# Altium footprint library Mine.PcbLib: 306 footprints (part 4 of 20)
Each footprint in its own frame and in the unit in brackets; x right, y up, seen from the top. Pads: shape width x height; smd on the part's side, far side on the other; paste and mask are expansions set on the pad; w line width, h text height; cw(c..) or ccw(c..) is an arc to the next point about the centre after c.
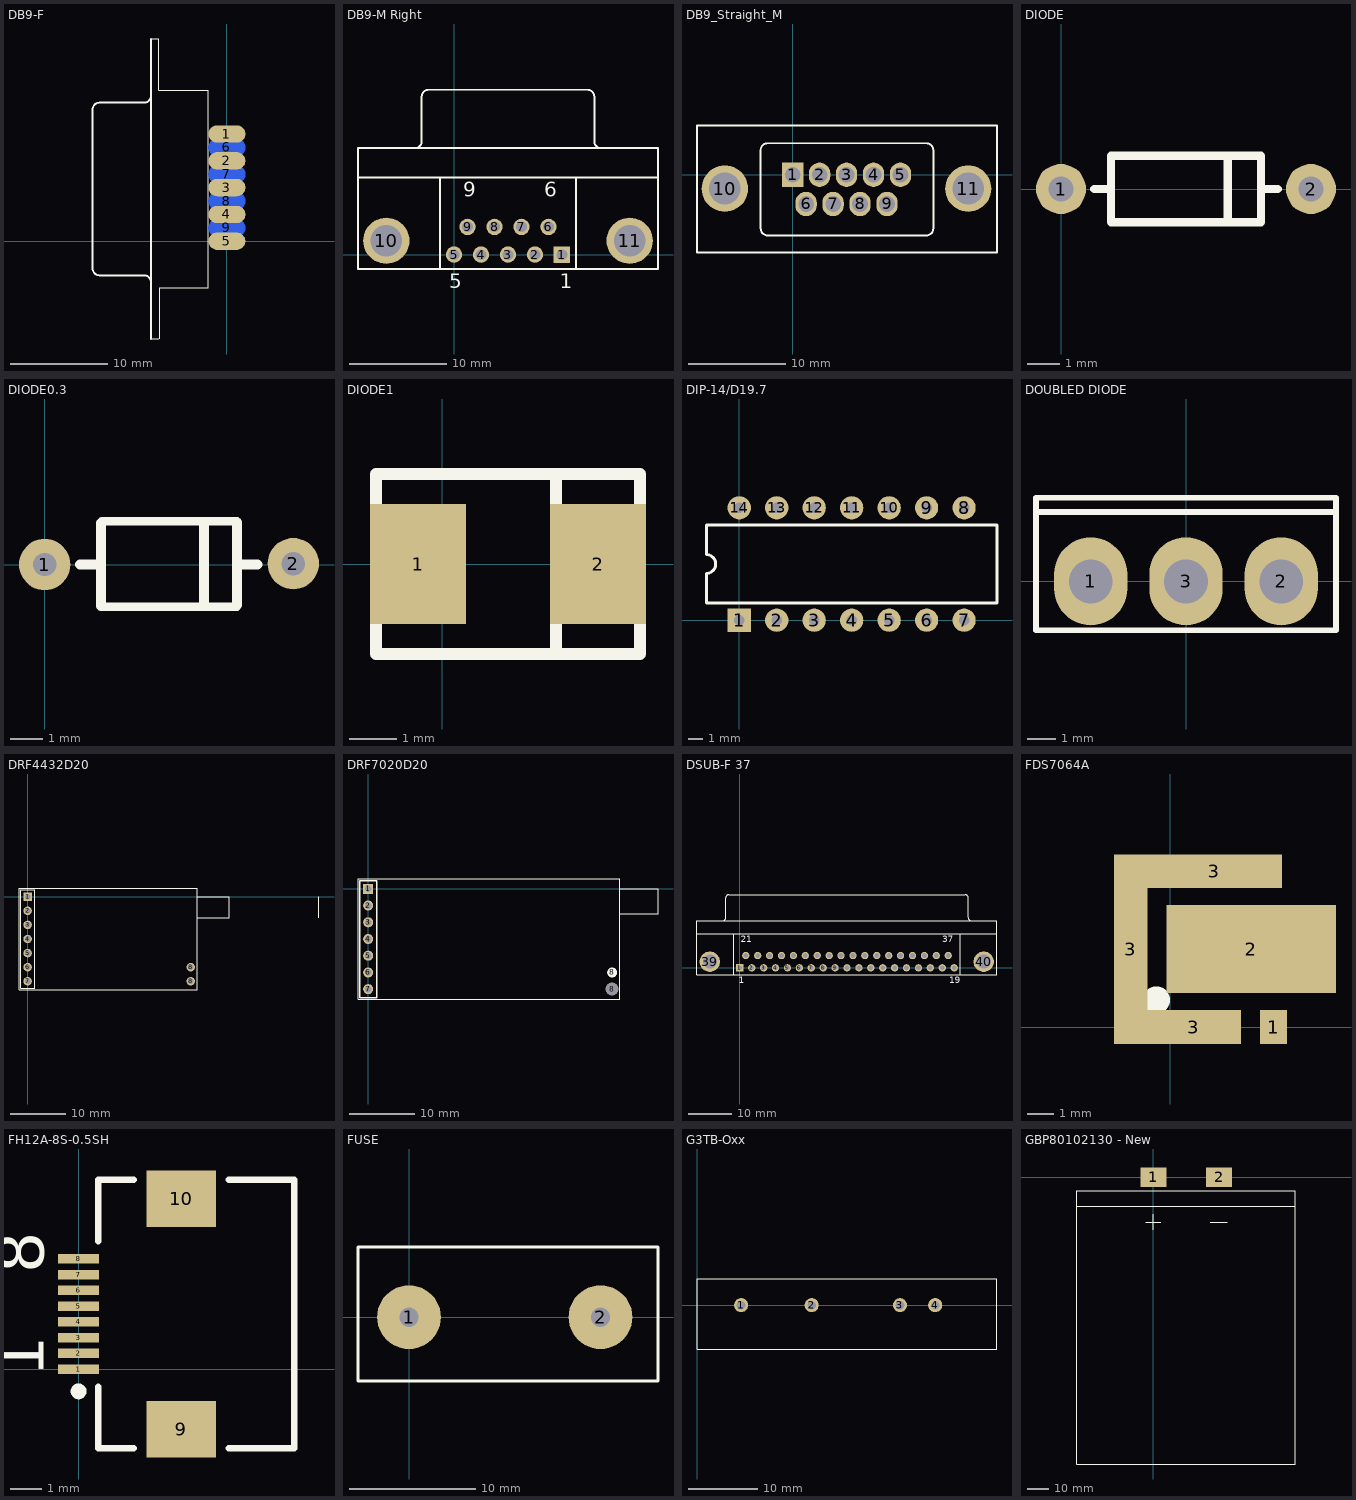
[diagram p3: the footprints below, top view; thin cyan lines are the x and y axes]

## DB9-F [mil]
pads (9):
  oval 150x70 smd: 1(0,433.33) 2(0,325) 3(0,216.67) 4(0,108.33) 5(0,0)
  oval 150x70 smd far side: 6(0,379) 7(0,270.67) 8(0,162.33) 9(0,54)
Top Overlay:
  lines w5: -307.09,-395.26 -275.59,-395.26 ; -307.09,817.34 -275.59,817.34 -275.59,610.24 -74.8,610.24 -74.8,-188.98 -271.65,-188.98 -271.65,-395.26
  lines w7.87: -515.94,-137.78 cw(c-515.94,-110.42) -543.31,-110.42 -543.31,532.5 cw(c-515.94,532.5) -515.94,559.86 ; -515.75,-137.98 -334.65,-137.98 cw(c-334.65,-165.34) -307.28,-165.34 ; -515.75,560.05 -334.65,560.05 ccw(c-334.65,587.42) -307.28,587.42 ; -307.09,-395.26 -307.09,817.34

## DB9-M Right [mm]
height 13
pads (11):
  rect 1.69x1.69 hole 1.09: 1(11.08,0)
  round 1.69 hole 1.09: 2(8.31,0) 3(5.54,0) 4(2.77,0) 5(0,0) 6(9.695,2.84) 7(6.925,2.84) 8(4.155,2.84) 9(1.385,2.84)
  round 4.76 hole 3.26: 10(-6.955,1.42) 11(18.035,1.42)
Top Overlay:
  lines w0.2: -9.86,7.92 20.94,7.92 ; -4.02,10.925 ccw(c-4.02,11.62) -3.325,11.62 -3.325,16.22 ; -3.32,16.225 cw(c-2.625,16.225) -2.625,16.92 13.705,16.92 cw(c13.705,16.225) 14.4,16.225 ; -1.46,-1.48 -1.46,7.92 ; 12.54,-1.48 12.54,7.92 ; 14.405,16.22 14.405,11.62 ccw(c15.1,11.62) 15.1,10.925 ; -9.86,-1.48 20.94,-1.48 20.94,10.92 -9.86,10.92 -9.86,-1.48
  text "1" at 10.861,-3.455 h1.5
  text "6" at 9.25,5.945 h1.5
  text "9" at 0.94,5.945 h1.5
  text "5" at -0.469,-3.455 h1.5

## DB9_Straight_M [mm]
height 12
pads (11):
  rect 2.2x2.5 hole 1.6: 1(0,0)
  oval 2.2x2.5 hole 1.6: 2(2.77,0) 3(5.54,0) 4(8.31,0) 5(11.08,0) 6(1.385,-3) 7(4.155,-3) 8(6.925,-3) 9(9.695,-3)
  round 4.76 hole 3.26: 10(-6.955,-1.42) 11(18.035,-1.42)
Top Overlay:
  lines w0.2: -3.277,-5.523 -3.277,2.54 cw(c-2.582,2.54) -2.582,3.235 13.748,3.235 cw(c13.748,2.54) 14.443,2.54 ; -3.272,-5.528 ccw(c-2.577,-5.528) -2.577,-6.223 13.753,-6.223 ccw(c13.753,-5.528) 14.448,-5.528 ; 14.453,-5.523 14.453,2.54 ; -9.812,-8.001 -9.812,5.08 20.988,5.08 20.988,-8.001 -9.812,-8.001

## DIODE [mil]
pads (2):
  round 60 hole 30: 1(0,0) 2(300,0)
Top Overlay:
  lines w10: 40,0 60,0 ; 200,-40 200,40 ; 240,0 260,0 ; 60,0 60,-40 240,-40 240,40 60,40 60,0

## DIODE0.3 [mil]
pads (2):
  round 62 hole 28: 1(0,0) 2(300,1)
Top Overlay:
  lines w10: 68.71,-50.89 232.05,-50.89 ; 68.71,52.11 232.05,52.11
  lines w12: 42.77,0.11 67.77,0.11 ; 67.77,-49.89 67.77,50.11 ; 192.05,-49.89 192.05,50.11 ; 232,-49 232,51 ; 232,0 257,0

## DIODE1 [mil]
height 86.61
pads (2):
  rect 80x100 smd: 1(-20,0) 2(130,0)
Top Overlay:
  lines w10: 95,-75 95,75 ; -55,-75 165,-75 165,75 -55,75 -55,-75

## DIP-14/D19.7 [mil]
pads (14):
  rect 62x62 hole 28: 1(0,0)
  round 62 hole 28: 2(100,0) 3(200,0) 4(300,0) 5(400,0) 6(500,0) 7(600,0) 8(600,300) 9(500,300) 10(400,300) 11(300,300) 12(200,300) 13(100,300) 14(0,300)
Top Overlay:
  lines w7.87: -87.79,45.67 687.8,45.67 687.8,254.33 -87.79,254.33 -87.79,175 cw(c-87.8,150) -87.8,125 -87.79,45.67

## DOUBLED DIODE [mil]
pads (3):
  oval 100x120 hole 60: 1(-130,0) 2(130,0) 3(0,0)
Top Overlay:
  lines w7.87: -204.72,94.49 204.72,94.49 ; -204.72,-66.93 -204.72,114.17 204.72,114.17 204.72,-66.93 -204.72,-66.93

## DRF4432D20 [mil]
height 275.59
pads (9):
  rect 60x60 hole 40: 1(0,0)
  round 60 hole 40: 2(0,-100) 3(0,-200) 4(0,-300) 5(0,-400) 6(0,-500) 7(0,-600) 8(1158.29,-600) 8(1158.29,-500)
Top Overlay:
  lines w5: 1202.78,-150 1432.66,-150 1432.66,0 1202.78,0 ; 2068.92,-150 2068.92,0 ; -61,-660.24 1202.78,-660.24 1202.78,60.24 -61,60.24 -61,-660.24
  lines w7.87: -50,-651 50,-651 50,50 -50,50 -50,-651

## DRF7020D20 [mil]
height 275.59
pads (9):
  rect 60x60 hole 40: 1(0,0)
  round 60 hole 40: 2(0,-100) 3(0,-200) 4(0,-300) 5(0,-400) 6(0,-500) 7(0,-600)
  round 60 hole 78.74: 8(1460.63,-600)
  round 60 on Top Overlay: 8(1460.63,-500)
Top Overlay:
  lines w5: 1505.12,-150 1735,-150 1735,0 1505.12,0 ; -61,-660.24 1505.12,-660.24 1505.12,60.24 -61,60.24 -61,-660.24
  lines w7.87: -50,-651 50,-651 50,50 -50,50 -50,-651

## DSUB-F 37 [mm]
height 13
pads (39):
  rect 1.69x1.69 hole 1.09: 1(0,0)
  round 1.69 hole 1.09: 2(2.761,0) 3(5.522,0) 4(8.283,0) 5(11.044,0) 6(13.805,0) 7(16.566,0) 8(19.327,0) 9(22.088,0) 10(24.849,0) 11(27.61,0) 12(30.371,0) 13(33.132,0) 14(35.893,0) 15(38.654,0) 16(41.415,0) 17(44.176,0) 18(46.937,0) 19(49.698,0) 20(1.381,2.84) 21(4.142,2.84) 22(6.903,2.84) 23(9.664,2.84) 24(12.424,2.84) 25(15.185,2.84) 26(17.946,2.84) 27(20.707,2.84) 28(23.469,2.84) 29(26.23,2.84) 30(28.991,2.84) 31(31.752,2.84) 32(34.513,2.84) 33(37.274,2.84) 34(40.035,2.84) 35(42.796,2.84) 36(45.557,2.84) 37(48.318,2.84)
  round 4.76 hole 3.26: 39(-6.96,1.42) 40(56.55,1.42)
Top Overlay:
  lines w0.2: -9.93,7.92 59.628,7.92 ; -3.975,10.925 ccw(c-3.975,11.62) -3.28,11.62 -3.28,16.22 ; -3.275,16.225 cw(c-2.58,16.225) -2.58,16.92 52.283,16.92 cw(c52.283,16.225) 52.978,16.225 ; -1.38,-1.58 -1.38,7.92 ; 51.078,-1.58 51.078,7.92 ; 52.978,11.615 ccw(c53.673,11.615) 53.673,10.92 ; 52.978,11.684 52.978,16.284 ; -9.93,-1.58 -9.93,10.92 59.628,10.92 59.628,-1.58 -9.93,-1.58
  text "37" at 46.99,5.969 h1.5
  text "21" at 0.256,5.945 h1.5
  text "19" at 48.514,-3.556 h1.5
  text "1" at -0.25,-3.555 h1.5

## FDS7064A [mil]
height 78.74
pads (5):
  rect 40x50 smd paste+0: 1(153,0)
  rect 250x130 smd: 2(120,115)
  rect 50x280 smd: 3(-58,115)
  rect 140x50 smd: 3(35,0)
  rect 200x50 smd: 3(65,230)
Top Overlay:
  circle w20: c-20,40 r10

## FH12A-8S-0.5SH [mm]
height 2
pads (10):
  rect 1.3x0.3 smd: 1(0,0) 2(0,0.5) 3(0,1) 4(0,1.5) 5(0,2) 6(0,2.5) 7(0,3) 8(0,3.5)
  rect 2.2x1.8 smd: 9(3.25,-1.9) 10(3.25,5.4)
Top Overlay:
  circle w0.25: c0,-0.7 r0.125
  lines w0.2: 0.625,-0.55 0.625,-2.5 1.75,-2.5 ; 0.625,4.05 0.625,6 1.75,6 ; 4.75,-2.5 6.825,-2.5 6.825,6 4.75,6
  text "1" at -1.1,-0.25 h1.5
  text "8" at -1.1,3.048 h1.5

## FUSE [mil]
pads (2):
  round 200 hole 60: 1(0,0) 2(600,0)
Top Overlay:
  lines w10: -160,-200 780,-200 780,220 -160,220 -160,-200

## G3TB-Oxx [mil]
height 1200.79
pads (4):
  round 80 hole 50: 1(250,0) 2(650,0) 3(1150,0) 4(1350,0)
Top Overlay:
  lines w5: 0,-250 0,150 1700,150 1700,-250 0,-250

## GBP80102130 - New [mm]
height 8.5
pads (2):
  rect 12x8.89 smd: 1(0,0) 2(30,0)
Top Overlay:
  lines w0.127: -35.103,-13.223 64.897,-13.223 ; -34.671,-131.223 -35.103,-131.223 ; -35.103,-131.223 -35.103,-6.223 64.897,-6.223 64.897,-131.223 -35.103,-131.223
  lines w0.254: -3.556,-20.574 3.429,-20.574 ; 0,-24.13 0,-17.018 ; 25.908,-20.701 33.655,-20.701